# Altium footprint library LibraryOfficial_PCBLib_Hnit_20230222.PcbLib: 9 footprints
Each footprint in its own frame and in the unit in brackets; x right, y up, seen from the top. Pads: shape width x height; smd on the part's side, far side on the other; paste and mask are expansions set on the pad; w line width, h text height; cw(c..) or ccw(c..) is an arc to the next point about the centre after c.
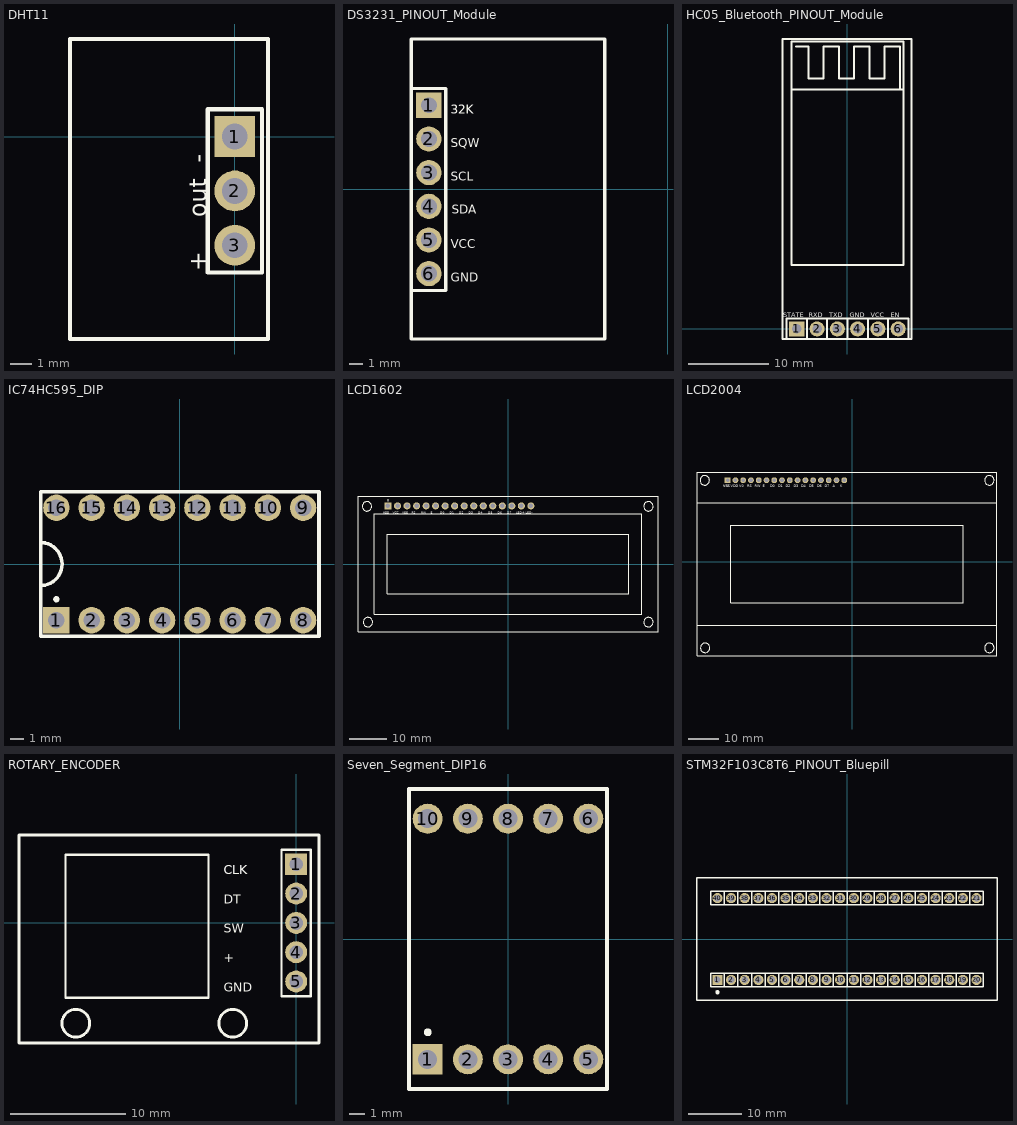
[diagram p0: the footprints below, top view; thin cyan lines are the x and y axes]

## DHT11 [mm] "Humidity, Temperature Digital ±5% RH Through Hole, 3 pins, pin distance 2.54mm"
height 32
pads (3):
  rect 1.9x1.9 hole 1.2: 1(0,0)
  round 1.9 hole 1.2: 2(0,-2.54) 3(0,-5.08)
Top Overlay:
  lines w0.2: -7.7,-9.45 -7.7,4.55 -0.88,4.55 1.55,4.55 1.55,-9.45 -7.7,-9.45 ; -1.27,-6.35 -1.27,1.27 0,1.27 1.27,1.27 1.27,-6.35 -1.27,-6.35
  text "-" at -1.33,-1.22 h0.8
  text "-" at -1.33,-1.22 h0.8
  text "out" at -1.33,-3.76 h0.8
  text "+" at -1.33,-6.3 h0.8
3D body "User Library-DHT11-2.STEP": height 29.75, standoff -5.41, extent -7.23,-9.21 1.16,4.05

## DS3231_PINOUT_Module [mm] "RTC MODULE CLK/CALENDAR I2C 16SOIC"
height 15
pads (6):
  rect 1.9x1.9 hole 1.2: 1(-18.026,6.35)
  round 1.9 hole 1.2: 2(-18.026,3.81) 3(-18.026,1.27) 4(-18.026,-1.27) 5(-18.026,-3.81) 6(-18.026,-6.35)
Top Overlay:
  lines w0.254: -19.286,-7.624 -16.746,-7.624 -16.746,-5.084 -16.746,-2.544 -16.746,-0.004 -16.746,2.536 -16.746,5.076 -16.746,7.616 -19.286,7.616 ; -19.355,-11.28 -19.355,11.35 -4.75,11.35 -4.75,-11.28 -19.355,-11.28
  text "GND" at -16.358,-6.98 h0.65
  text "VCC" at -16.358,-4.44 h0.65
  text "SDA" at -16.307,-1.849 h0.65
  text "SCL" at -16.358,0.64 h0.65
  text "SQW" at -16.358,3.18 h0.65
  text "32K" at -16.358,5.72 h0.65
  text "32K" at -16.383,5.72 h0.65
3D body "User Library-DS3231 RTC-1.STEP": height 40.3, standoff -4.45, extent -18.23,-11.46 -4.7,11.34

## HC05_Bluetooth_PINOUT_Module [mm] "HC05 Bluetooth Module RF Grove Platform Evaluation Expansion Board"
height 2
pads (6):
  rect 1.9x1.9 hole 1.2: 1(-6.35,0)
  round 1.9 hole 1.2: 2(-3.81,0) 3(-1.27,0) 4(1.27,0) 5(3.81,0) 6(6.35,0)
Top Overlay:
  lines w0.254: -7,30 7,30 ; -6.477,35.394 -4.889,35.394 -4.889,31.394 -2.984,31.394 -2.984,35.394 -1.079,35.394 -1.079,31.394 0.826,31.394 0.826,35.394 2.73,35.394 2.73,31.394 4.635,31.394 ; 4.648,31.408 4.648,35.408 6.553,35.408 6.553,30.15 ; -7.62,-1.27 -5.08,-1.27 ; -7.62,-1.27 -7.62,1.27 ; -7.62,-1.27 -5.08,-1.27 ; -7.62,-1.27 -7.62,1.27 ; -7.62,1.27 -5.08,1.27 ; -7.62,1.27 -5.08,1.27 ; -5.08,-1.27 -2.54,-1.27 ; -5.08,-1.27 -5.08,1.27 ; -5.08,-1.27 -5.08,1.27 ; -5.08,-1.27 -5.08,1.27 ; -5.08,1.27 -2.54,1.27 ; -2.54,-1.27 0,-1.27 ; -2.54,-1.27 -2.54,1.27 ; -2.54,-1.27 -2.54,1.27 ; -2.54,1.27 0,1.27 ; 0,-1.27 2.54,-1.27 ; 0,-1.27 0,1.27 ; 0,-1.27 0,1.27 ; 0,1.27 2.54,1.27 ; 2.54,-1.27 5.08,-1.27 ; 2.54,-1.27 2.54,1.27 ; 2.54,-1.27 2.54,1.27 ; 2.54,1.27 5.08,1.27 ; 5.08,-1.27 7.62,-1.27 7.62,1.27 5.08,1.27 ; 5.08,-1.27 5.08,1.27 ; 5.08,-1.27 5.08,1.27 ; -8.153,36.322 7.998,36.322 8.028,-1.27 -8.124,-1.27 -8.153,36.322 ; -7,8 7,8 7,36 -7,36 -7,8
  text "STATE" at -8.026,1.448 h0.6
  text "RXD" at -4.864,1.446 h0.6
  text "VCC" at 2.909,1.446 h0.6
  text "GND" at 0.292,1.446 h0.6
  text "TXD" at -2.273,1.446 h0.6
  text "EN" at 5.451,1.446 h0.6
3D body "HC-SERIES.stp": height 7.31, standoff -4.12, extent -7.85,-1.27 7.85,36.33

## IC74HC595_DIP [mm] "16 Pins, Height 8.38mm, Pin to pin 100 mil, DIP type"
height 8.38
pads (16):
  rect 1.9x1.9 hole 1.2: 1(-8.89,-4.05)
  round 1.9 hole 1.2: 2(-6.35,-4.05) 3(-3.81,-4.05) 4(-1.27,-4.05) 5(1.27,-4.05) 6(3.81,-4.05) 7(6.35,-4.05) 8(8.89,-4.05) 9(8.89,4.05) 10(6.35,4.05) 11(3.81,4.05) 12(1.27,4.05) 13(-1.27,4.05) 14(-3.81,4.05) 15(-6.35,4.05) 16(-8.89,4.05)
Top Overlay:
  circle w0.254: c-8.89,-2.54 r0.1
  lines w0.254: -9.914,-1.546 ccw(c-10.033,0) -9.908,1.545 ; -10.033,-5.207 10.033,-5.207 10.033,5.207 -10.033,5.207 -10.033,-5.207
3D body "sn74hc595n.stp": height 5.05, standoff -3.34, extent -9.652,-4.629 9.652,4.449

## LCD1602 [mm] "LCD1602, or 1602 character-type liquid crystal display, is a kind of dot matrix module to show letters, numbers, and characters and so on. It's composed of 5x7 or 5x11 dot matrix positions; each position can display one character"
height 13
pads (16):
  rect 1.9x1.9 hole 1.2: 1(-32,15.5)
  round 1.9 hole 1.2: 2(-29.46,15.5) 3(-26.92,15.5) 4(-24.38,15.5) 5(-21.84,15.5) 6(-19.3,15.5) 7(-16.76,15.5) 8(-14.22,15.5) 9(-11.68,15.5) 10(-9.14,15.5) 11(-6.6,15.5) 12(-4.06,15.5) 13(-1.52,15.5) 14(1.02,15.5) 15(3.56,15.5) 16(6.1,15.5)
Top Overlay:
  circle w0.254: c-37.338,-15.494 r1.25
  circle w0.254: c37.465,-15.494 r1.25
  circle w0.254: c37.465,15.367 r1.25
  circle w0.254: c-37.592,15.367 r1.25
  circle w0.3: c-32,17 r0.1
  lines w0.254: -40,-18 -40,18 40,18 40,-18 -40,-18 ; -35.65,-13.4 -35.65,13.4 35.65,13.4 35.65,-13.4 -35.65,-13.4 ; -32.25,-8 32.25,-8 32.25,8 -32.25,8 -32.25,0 -32.25,-8
  text "LED-" at 4.746,13.446 h0.6
  text "LED+" at 2.206,13.446 h0.6
  text "D7" at -0.25,13.446 h0.6
  text "D6" at -2.79,13.446 h0.6
  text "D5" at -5.33,13.446 h0.6
  text "D4" at -7.87,13.446 h0.6
  text "D3" at -10.41,13.446 h0.6
  text "D2" at -12.95,13.446 h0.6
  text "D1" at -15.49,13.446 h0.6
  text "D0" at -18.03,13.446 h0.6
  text "E" at -20.57,13.446 h0.6
  text "RW" at -23.11,13.446 h0.6
  text "RS" at -25.65,13.446 h0.6
  text "VEE" at -28.19,13.446 h0.6
  text "VCC" at -30.73,13.446 h0.6
  text "VSS" at -33.27,13.446 h0.6
  text "VSS" at -33.27,13.446 h0.6
3D body "LCD.STEP": height 20.56, standoff -2.45, extent -40,-18 40,18

## LCD2004 [mm] "LCD2004, or 2004 character-type liquid crystal display, is a kind of dot matrix module to show letters, numbers, and characters and so on. It's composed of 5x8 dot matrix positions; each position can display one character"
height 14
pads (16):
  rect 1.9x1.9 hole 1.2: 1(-40.767,26.543)
  round 1.9 hole 1.2: 2(-38.227,26.543) 3(-35.687,26.543) 4(-33.147,26.543) 5(-30.607,26.543) 6(-28.067,26.543) 7(-25.527,26.543) 8(-22.987,26.543) 9(-20.447,26.543) 10(-17.907,26.543) 11(-15.367,26.543) 12(-12.827,26.543) 13(-10.287,26.543) 14(-7.747,26.543) 15(-5.207,26.543) 16(-2.667,26.543)
Top Overlay:
  circle w0.254: c44.737,26.526 r1.55
  circle w0.254: c44.737,-28.211 r1.55
  circle w0.254: c-48.1,-28.211 r1.55
  circle w0.254: c-48.227,26.526 r1.55
  lines w0.254: -50.767,-30.807 47.233,-30.807 47.233,29.193 -50.767,29.193 -50.767,-30.807 ; -50.767,-20.807 47.233,-20.807 47.233,19.193 -50.767,19.193 -50.767,-20.807 ; -39.767,-13.407 36.233,-13.407 36.233,11.793 -39.767,11.793 -39.767,-0.807 -39.767,-13.407
  text "D1" at -24.257,24.235 h0.8
  text "RW" at -31.877,24.235 h0.8
  text "D4" at -16.637,24.235 h0.8
  text "V0" at -36.957,24.235 h0.8
  text "D7" at -9.017,24.235 h0.8
  text "VDD" at -39.731,24.235 h0.8
  text "RS" at -34.417,24.235 h0.8
  text "D0" at -26.797,24.235 h0.8
  text "D6" at -11.557,24.235 h0.8
  text "VSS" at -42.271,24.235 h0.8
  text "D3" at -19.177,24.235 h0.8
  text "K" at -3.937,24.235 h0.8
  text "E" at -29.337,24.235 h0.8
  text "VSS" at -42.271,24.235 h0.8
  text "D2" at -21.717,24.235 h0.8
  text "A" at -6.477,24.235 h0.8
  text "D5" at -14.097,24.235 h0.8
3D body "LCD Display 2004.stp": height 11.74, standoff -1.91, extent -50.836,-30.751 47.233,29.193

## ROTARY_ENCODER [mm] "Board 0.197\" (5.00mm) Through Hole"
pads (5):
  rect 1.9x1.9 hole 1.2: 1(0,5.08)
  round 1.9 hole 1.2: 2(0,2.54) 3(0,0) 4(0,-2.54) 5(0,-5.08)
Top Overlay:
  circle w0.254: c-19.1,-8.7 r1.2
  circle w0.254: c-5.5,-8.7 r1.2
  lines w0.2: -20,-6.5 -7.6,-6.5 -7.6,5.9 -20,5.9 -20,-6.5 ; -1.27,-6.35 -1.27,6.35 0,6.35 1.27,6.35 1.27,-6.35 0,-6.35 -1.27,-6.35
  lines w0.254: -24.024,-10.397 -24.024,7.603 1.976,7.603 1.976,-1.397 1.976,-10.397 -24.024,-10.397
  text "CLK" at -6.287,4.213 h0.8
  text "CLK" at -6.287,4.213 h0.8
  text "DT" at -6.287,1.673 h0.8
  text "SW" at -6.287,-0.867 h0.8
  text "+" at -6.287,-3.407 h0.8
  text "GND" at -6.287,-5.947 h0.8
3D body "Encoder KY-040.STEP": height 20.05, standoff 0.99, extent -24.092,-10.697 2.108,7.903

## Seven_Segment_DIP16 [mm] "WL-T7DS 7 SEGMENTS DISPLAY THT S"
height 14.3
pads (10):
  rect 1.9x1.9 hole 1.2: 1(-5.08,-7.607)
  round 1.9 hole 1.2: 2(-2.54,-7.607) 3(0,-7.607) 4(2.54,-7.607) 5(5.08,-7.607) 6(5.08,7.607) 7(2.54,7.607) 8(0,7.607) 9(-2.54,7.607) 10(-5.08,7.607)
Top Overlay:
  circle w0.3: c-5.075,-5.9 r0.1
  lines w0.254: -6.25,-9.487 6.25,-9.487 6.25,9.487 -6.25,9.487 -6.25,-9.487
3D body "User Library-7-Segment.STEP": height 8, standoff -6.3, extent -6.325,-9.519 6.275,9.481

## STM32F103C8T6_PINOUT_Bluepill [mm] "40 pins, Pin to pin 2.54mm, Pinout type"
height 2.54
pads (40):
  rect 1.9x1.9 hole 1.2: 1(-24.13,-7.62)
  round 1.9 hole 1.2: 2(-21.59,-7.62) 3(-19.05,-7.62) 4(-16.51,-7.62) 5(-13.97,-7.62) 6(-11.43,-7.62) 7(-8.89,-7.62) 8(-6.35,-7.62) 9(-3.81,-7.62) 10(-1.27,-7.62) 11(1.27,-7.62) 12(3.81,-7.62) 13(6.35,-7.62) 14(8.89,-7.62) 15(11.43,-7.62) 16(13.97,-7.62) 17(16.51,-7.62) 18(19.05,-7.62) 19(21.59,-7.62) 20(24.13,-7.62) 21(24.13,7.62) 22(21.59,7.62) 23(19.05,7.62) 24(16.51,7.62) 25(13.97,7.62) 26(11.43,7.62) 27(8.89,7.62) 28(6.35,7.62) 29(3.81,7.62) 30(1.27,7.62) 31(-1.27,7.62) 32(-3.81,7.62) 33(-6.35,7.62) 34(-8.89,7.62) 35(-11.43,7.62) 36(-13.97,7.62) 37(-16.51,7.62) 38(-19.05,7.62) 39(-21.59,7.62) 40(-24.13,7.62)
Top Overlay:
  drawing of 173 lines, arcs and shapes, not listed
3D body "STM32F103C8T6_Blue_Pill_v6.step": height 12.31, standoff -5.96, extent -30.025,-11.43 27.535,11.43